# Altium schematic symbol library jlcpcb_2025_04_capacitors_extended_0603.schlib: 3668 symbols (part 12 of 20)
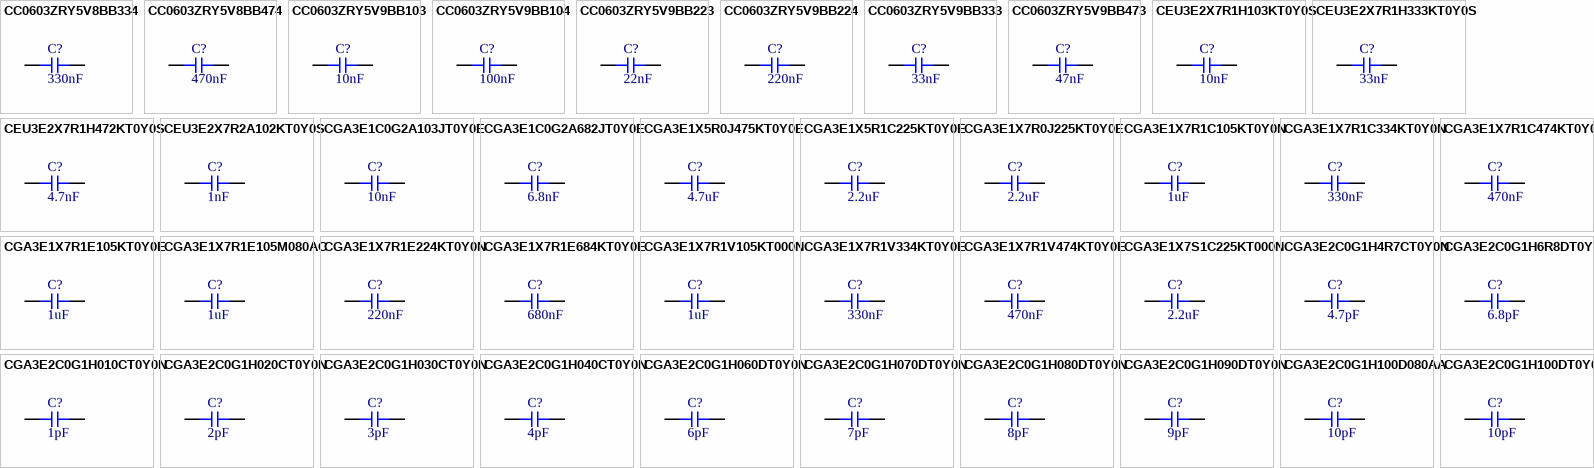
[diagram p102: symbols CC0603ZRY5V8BB334 to CGA3E2C0G1H100DT0Y0N]

## CEU3E2X7R2A102KT0Y0S
designator C?  Capacitance: 1nF  (hidden comment: *)
Capacitor, Ceramic (MLCC), 1nF, ±10%, 100V, X7R, ±10%, SMD 0603; Manufacturer: TDK; Manufacturer Part Number: CEU3E2X7R2A102KT0Y0S; Package Size: 0603; JLCPCB Basic Part: No; JLCPCB Part Number: C694208; Supplier 1: LCSC; Category: Capacitors - MLCC; Supplier Part Number 1: C694208; Tolerance: ±10%; Voltage Rating: 100V; Temperature Coefficient: X7R; RoHS: Yes; ComponentLink1Description: Datasheet; ComponentLink1URL: https://wmsc.lcsc.com/wmsc/upload/file/pdf/v2/lcsc/2011111536_TDK-CEU3E2X7R2A102KT0Y0S_C694208.pdf; ComponentLink2Description: JLCPCB Part URL; ComponentLink2URL: https://jlcpcb.com/partdetail/C694208; ComponentLink3Description: LCSC Part URL; ComponentLink3URL: https://lcsc.com/product-detail/Multilayer-Ceramic-Capacitors-MLCC---SMD-SMT_TDK-TDK-CEU3E2X7R2A102KT0Y0S_C694208.html
footprint CAP-0603 (0603 (1608M) Capacitor)
pins: 1, 2

## CGA3E1C0G2A103JT0Y0E
designator C?  Capacitance: 10nF  (hidden comment: *)
Capacitor, Ceramic (MLCC), 10nF, ±5%, 100V, C0G, ±5%, SMD 0603; Manufacturer: TDK; Manufacturer Part Number: CGA3E1C0G2A103JT0Y0E; Package Size: 0603; JLCPCB Basic Part: No; JLCPCB Part Number: C432938; Supplier 1: LCSC; Category: Capacitors - MLCC; Supplier Part Number 1: C432938; Tolerance: ±5%; Voltage Rating: 100V; Temperature Coefficient: C0G; RoHS: Yes; ComponentLink1Description: Datasheet; ComponentLink1URL: https://wmsc.lcsc.com/wmsc/upload/file/pdf/v2/lcsc/2304140030_TDK-CGA3E1C0G2A103JT0Y0E_C432938.pdf; ComponentLink2Description: JLCPCB Part URL; ComponentLink2URL: https://jlcpcb.com/partdetail/C432938; ComponentLink3Description: LCSC Part URL; ComponentLink3URL: https://lcsc.com/product-detail/Multilayer-Ceramic-Capacitors-MLCC---SMD-SMT_TDK-TDK-CGA3E1C0G2A103JT0Y0E_C432938.html
footprint CAP-0603 (0603 (1608M) Capacitor)
pins: 1, 2

## CGA3E1C0G2A682JT0Y0E
designator C?  Capacitance: 6.8nF  (hidden comment: *)
Capacitor, Ceramic (MLCC), 6.8nF, ±5%, 100V, C0G, ±5%, SMD 0603; Manufacturer: TDK; Manufacturer Part Number: CGA3E1C0G2A682JT0Y0E; Package Size: 0603; JLCPCB Basic Part: No; JLCPCB Part Number: C432939; Supplier 1: LCSC; Category: Capacitors - MLCC; Supplier Part Number 1: C432939; Tolerance: ±5%; Voltage Rating: 100V; Temperature Coefficient: C0G; RoHS: Yes; ComponentLink1Description: Datasheet; ComponentLink1URL: https://wmsc.lcsc.com/wmsc/upload/file/pdf/v2/lcsc/2304140030_TDK-CGA3E1C0G2A682JT0Y0E_C432939.pdf; ComponentLink2Description: JLCPCB Part URL; ComponentLink2URL: https://jlcpcb.com/partdetail/C432939; ComponentLink3Description: LCSC Part URL; ComponentLink3URL: https://lcsc.com/product-detail/Multilayer-Ceramic-Capacitors-MLCC---SMD-SMT_TDK-TDK-CGA3E1C0G2A682JT0Y0E_C432939.html
footprint CAP-0603 (0603 (1608M) Capacitor)
pins: 1, 2

## CGA3E1X5R0J475KT0Y0E
designator C?  Capacitance: 4.7uF  (hidden comment: *)
Capacitor, Ceramic (MLCC), 4.7uF, ±10%, 6.3V, X5R, ±10%, SMD 0603; Manufacturer: TDK; Manufacturer Part Number: CGA3E1X5R0J475KT0Y0E; Package Size: 0603; JLCPCB Basic Part: No; JLCPCB Part Number: C338087; Supplier 1: LCSC; Category: Capacitors - MLCC; Supplier Part Number 1: C338087; Tolerance: ±10%; Voltage Rating: 6.3V; Temperature Coefficient: X5R; RoHS: Yes; ComponentLink1Description: Datasheet; ComponentLink1URL: https://wmsc.lcsc.com/wmsc/upload/file/pdf/v2/lcsc/2304140030_TDK-CGA3E1X5R0J475KT0Y0E_C338087.pdf; ComponentLink2Description: JLCPCB Part URL; ComponentLink2URL: https://jlcpcb.com/partdetail/C338087; ComponentLink3Description: LCSC Part URL; ComponentLink3URL: https://lcsc.com/product-detail/Multilayer-Ceramic-Capacitors-MLCC---SMD-SMT_TDK-TDK-CGA3E1X5R0J475KT0Y0E_C338087.html
footprint CAP-0603 (0603 (1608M) Capacitor)
pins: 1, 2

## CGA3E1X5R1C225KT0Y0E
designator C?  Capacitance: 2.2uF  (hidden comment: *)
Capacitor, Ceramic (MLCC), 2.2uF, ±10%, 16V, X5R, ±10%, SMD 0603; Manufacturer: TDK; Manufacturer Part Number: CGA3E1X5R1C225KT0Y0E; Package Size: 0603; JLCPCB Basic Part: No; JLCPCB Part Number: C342965; Supplier 1: LCSC; Category: Capacitors - MLCC; Supplier Part Number 1: C342965; Tolerance: ±10%; Voltage Rating: 16V; Temperature Coefficient: X5R; RoHS: Yes; ComponentLink1Description: Datasheet; ComponentLink1URL: https://wmsc.lcsc.com/wmsc/upload/file/pdf/v2/lcsc/2304140030_TDK-CGA3E1X5R1C225KT0Y0E_C342965.pdf; ComponentLink2Description: JLCPCB Part URL; ComponentLink2URL: https://jlcpcb.com/partdetail/C342965; ComponentLink3Description: LCSC Part URL; ComponentLink3URL: https://lcsc.com/product-detail/Multilayer-Ceramic-Capacitors-MLCC---SMD-SMT_TDK-TDK-CGA3E1X5R1C225KT0Y0E_C342965.html
footprint CAP-0603 (0603 (1608M) Capacitor)
pins: 1, 2

## CGA3E1X7R0J225KT0Y0E
designator C?  Capacitance: 2.2uF  (hidden comment: *)
Capacitor, Ceramic (MLCC), 2.2uF, ±10%, 6.3V, X7R, ±10%, SMD 0603; Manufacturer: TDK; Manufacturer Part Number: CGA3E1X7R0J225KT0Y0E; Package Size: 0603; JLCPCB Basic Part: No; JLCPCB Part Number: C342879; Supplier 1: LCSC; Category: Capacitors - MLCC; Supplier Part Number 1: C342879; Tolerance: ±10%; Voltage Rating: 6.3V; Temperature Coefficient: X7R; RoHS: Yes; ComponentLink1Description: Datasheet; ComponentLink1URL: https://wmsc.lcsc.com/wmsc/upload/file/pdf/v2/lcsc/2304140030_TDK-CGA3E1X7R0J225KT0Y0E_C342879.pdf; ComponentLink2Description: JLCPCB Part URL; ComponentLink2URL: https://jlcpcb.com/partdetail/C342879; ComponentLink3Description: LCSC Part URL; ComponentLink3URL: https://lcsc.com/product-detail/Multilayer-Ceramic-Capacitors-MLCC---SMD-SMT_TDK-TDK-CGA3E1X7R0J225KT0Y0E_C342879.html
footprint CAP-0603 (0603 (1608M) Capacitor)
pins: 1, 2

## CGA3E1X7R1C105KT0Y0N
designator C?  Capacitance: 1uF  (hidden comment: *)
Capacitor, Ceramic (MLCC), 1uF, ±10%, 16V, X7R, ±10%, SMD 0603; Manufacturer: TDK; Manufacturer Part Number: CGA3E1X7R1C105KT0Y0N; Package Size: 0603; JLCPCB Basic Part: No; JLCPCB Part Number: C76706; Supplier 1: LCSC; Category: Capacitors - MLCC; Supplier Part Number 1: C76706; Tolerance: ±10%; Voltage Rating: 16V; Temperature Coefficient: X7R; RoHS: Yes; ComponentLink1Description: Datasheet; ComponentLink1URL: https://wmsc.lcsc.com/wmsc/upload/file/pdf/v2/lcsc/2304140030_TDK-CGA3E1X7R1C105KT0Y0N_C76706.pdf; ComponentLink2Description: JLCPCB Part URL; ComponentLink2URL: https://jlcpcb.com/partdetail/C76706; ComponentLink3Description: LCSC Part URL; ComponentLink3URL: https://lcsc.com/product-detail/Multilayer-Ceramic-Capacitors-MLCC---SMD-SMT_TDK-TDK-CGA3E1X7R1C105KT0Y0N_C76706.html
footprint CAP-0603 (0603 (1608M) Capacitor)
pins: 1, 2

## CGA3E1X7R1C334KT0Y0N
designator C?  Capacitance: 330nF  (hidden comment: *)
Capacitor, Ceramic (MLCC), 330nF, ±10%, 16V, X7R, ±10%, SMD 0603; Manufacturer: TDK; Manufacturer Part Number: CGA3E1X7R1C334KT0Y0N; Package Size: 0603; JLCPCB Basic Part: No; JLCPCB Part Number: C531425; Supplier 1: LCSC; Category: Capacitors - MLCC; Supplier Part Number 1: C531425; Tolerance: ±10%; Voltage Rating: 16V; Temperature Coefficient: X7R; RoHS: Yes; ComponentLink1Description: Datasheet; ComponentLink1URL: https://wmsc.lcsc.com/wmsc/upload/file/pdf/v2/lcsc/2304140030_TDK-CGA3E1X7R1C334KT0Y0N_C531425.pdf; ComponentLink2Description: JLCPCB Part URL; ComponentLink2URL: https://jlcpcb.com/partdetail/C531425; ComponentLink3Description: LCSC Part URL; ComponentLink3URL: https://lcsc.com/product-detail/Multilayer-Ceramic-Capacitors-MLCC---SMD-SMT_TDK-TDK-CGA3E1X7R1C334KT0Y0N_C531425.html
footprint CAP-0603 (0603 (1608M) Capacitor)
pins: 1, 2

## CGA3E1X7R1C474KT0Y0N
designator C?  Capacitance: 470nF  (hidden comment: *)
Capacitor, Ceramic (MLCC), 470nF, ±10%, 16V, X7R, ±10%, SMD 0603; Manufacturer: TDK; Manufacturer Part Number: CGA3E1X7R1C474KT0Y0N; Package Size: 0603; JLCPCB Basic Part: No; JLCPCB Part Number: C342915; Supplier 1: LCSC; Category: Capacitors - MLCC; Supplier Part Number 1: C342915; Tolerance: ±10%; Voltage Rating: 16V; Temperature Coefficient: X7R; RoHS: Yes; ComponentLink1Description: Datasheet; ComponentLink1URL: https://wmsc.lcsc.com/wmsc/upload/file/pdf/v2/lcsc/2304140030_TDK-CGA3E1X7R1C474KT0Y0N_C342915.pdf; ComponentLink2Description: JLCPCB Part URL; ComponentLink2URL: https://jlcpcb.com/partdetail/C342915; ComponentLink3Description: LCSC Part URL; ComponentLink3URL: https://lcsc.com/product-detail/Multilayer-Ceramic-Capacitors-MLCC---SMD-SMT_TDK-TDK-CGA3E1X7R1C474KT0Y0N_C342915.html
footprint CAP-0603 (0603 (1608M) Capacitor)
pins: 1, 2

## CGA3E1X7R1E105KT0Y0E
designator C?  Capacitance: 1uF  (hidden comment: *)
Capacitor, Ceramic (MLCC), 1uF, ±10%, 25V, X7R, ±10%, SMD 0603; Manufacturer: TDK; Manufacturer Part Number: CGA3E1X7R1E105KT0Y0E; Package Size: 0603; JLCPCB Basic Part: No; JLCPCB Part Number: C76708; Supplier 1: LCSC; Category: Capacitors - MLCC; Supplier Part Number 1: C76708; Tolerance: ±10%; Voltage Rating: 25V; Temperature Coefficient: X7R; RoHS: Yes; ComponentLink1Description: Datasheet; ComponentLink1URL: https://wmsc.lcsc.com/wmsc/upload/file/pdf/v2/lcsc/2304140030_TDK-CGA3E1X7R1E105KT0Y0E_C76708.pdf; ComponentLink2Description: JLCPCB Part URL; ComponentLink2URL: https://jlcpcb.com/partdetail/C76708; ComponentLink3Description: LCSC Part URL; ComponentLink3URL: https://lcsc.com/product-detail/Multilayer-Ceramic-Capacitors-MLCC---SMD-SMT_TDK-TDK-CGA3E1X7R1E105KT0Y0E_C76708.html
footprint CAP-0603 (0603 (1608M) Capacitor)
pins: 1, 2

## CGA3E1X7R1E105M080AC
designator C?  Capacitance: 1uF  (hidden comment: *)
Capacitor, Ceramic (MLCC), 1uF, ±20%, 25V, X7R, ±20%, SMD 0603; Manufacturer: TDK; Manufacturer Part Number: CGA3E1X7R1E105M080AC; Package Size: 0603; JLCPCB Basic Part: No; JLCPCB Part Number: C163178; Supplier 1: LCSC; Category: Capacitors - MLCC; Supplier Part Number 1: C163178; Tolerance: ±20%; Voltage Rating: 25V; Temperature Coefficient: X7R; RoHS: Yes; ComponentLink1Description: Datasheet; ComponentLink1URL: https://wmsc.lcsc.com/wmsc/upload/file/pdf/v2/lcsc/2304140030_TDK-CGA3E1X7R1E105M080AC_C163178.pdf; ComponentLink2Description: JLCPCB Part URL; ComponentLink2URL: https://jlcpcb.com/partdetail/C163178; ComponentLink3Description: LCSC Part URL; ComponentLink3URL: https://lcsc.com/product-detail/Multilayer-Ceramic-Capacitors-MLCC---SMD-SMT_TDK-TDK-CGA3E1X7R1E105M080AC_C163178.html
footprint CAP-0603 (0603 (1608M) Capacitor)
pins: 1, 2

## CGA3E1X7R1E224KT0Y0N
designator C?  Capacitance: 220nF  (hidden comment: *)
Capacitor, Ceramic (MLCC), 220nF, ±10%, 25V, X7R, ±10%, SMD 0603; Manufacturer: TDK; Manufacturer Part Number: CGA3E1X7R1E224KT0Y0N; Package Size: 0603; JLCPCB Basic Part: No; JLCPCB Part Number: C343001; Supplier 1: LCSC; Category: Capacitors - MLCC; Supplier Part Number 1: C343001; Tolerance: ±10%; Voltage Rating: 25V; Temperature Coefficient: X7R; RoHS: Yes; ComponentLink1Description: Datasheet; ComponentLink1URL: https://wmsc.lcsc.com/wmsc/upload/file/pdf/v2/lcsc/2304140030_TDK-CGA3E1X7R1E224KT0Y0N_C343001.pdf; ComponentLink2Description: JLCPCB Part URL; ComponentLink2URL: https://jlcpcb.com/partdetail/C343001; ComponentLink3Description: LCSC Part URL; ComponentLink3URL: https://lcsc.com/product-detail/Multilayer-Ceramic-Capacitors-MLCC---SMD-SMT_TDK-TDK-CGA3E1X7R1E224KT0Y0N_C343001.html
footprint CAP-0603 (0603 (1608M) Capacitor)
pins: 1, 2

## CGA3E1X7R1E684KT0Y0E
designator C?  Capacitance: 680nF  (hidden comment: *)
Capacitor, Ceramic (MLCC), 680nF, ±10%, 25V, X7R, ±10%, SMD 0603; Manufacturer: TDK; Manufacturer Part Number: CGA3E1X7R1E684KT0Y0E; Package Size: 0603; JLCPCB Basic Part: No; JLCPCB Part Number: C342960; Supplier 1: LCSC; Category: Capacitors - MLCC; Supplier Part Number 1: C342960; Tolerance: ±10%; Voltage Rating: 25V; Temperature Coefficient: X7R; RoHS: Yes; ComponentLink1Description: Datasheet; ComponentLink1URL: https://wmsc.lcsc.com/wmsc/upload/file/pdf/v2/lcsc/2304140030_TDK-CGA3E1X7R1E684KT0Y0E_C342960.pdf; ComponentLink2Description: JLCPCB Part URL; ComponentLink2URL: https://jlcpcb.com/partdetail/C342960; ComponentLink3Description: LCSC Part URL; ComponentLink3URL: https://lcsc.com/product-detail/Multilayer-Ceramic-Capacitors-MLCC---SMD-SMT_TDK-TDK-CGA3E1X7R1E684KT0Y0E_C342960.html
footprint CAP-0603 (0603 (1608M) Capacitor)
pins: 1, 2

## CGA3E1X7R1V105KT000N
designator C?  Capacitance: 1uF  (hidden comment: *)
Capacitor, Ceramic (MLCC), 1uF, ±10%, 35V, X7R, ±10%, SMD 0603; Manufacturer: TDK; Manufacturer Part Number: CGA3E1X7R1V105KT000N; Package Size: 0603; JLCPCB Basic Part: No; JLCPCB Part Number: C342956; Supplier 1: LCSC; Category: Capacitors - MLCC; Supplier Part Number 1: C342956; Tolerance: ±10%; Voltage Rating: 35V; Temperature Coefficient: X7R; RoHS: Yes; ComponentLink1Description: Datasheet; ComponentLink1URL: https://wmsc.lcsc.com/wmsc/upload/file/pdf/v2/lcsc/2304140030_TDK-CGA3E1X7R1V105KT000N_C342956.pdf; ComponentLink2Description: JLCPCB Part URL; ComponentLink2URL: https://jlcpcb.com/partdetail/C342956; ComponentLink3Description: LCSC Part URL; ComponentLink3URL: https://lcsc.com/product-detail/Multilayer-Ceramic-Capacitors-MLCC---SMD-SMT_TDK-TDK-CGA3E1X7R1V105KT000N_C342956.html
footprint CAP-0603 (0603 (1608M) Capacitor)
pins: 1, 2

## CGA3E1X7R1V334KT0Y0E
designator C?  Capacitance: 330nF  (hidden comment: *)
Capacitor, Ceramic (MLCC), 330nF, ±10%, 35V, X7R, ±10%, SMD 0603; Manufacturer: TDK; Manufacturer Part Number: CGA3E1X7R1V334KT0Y0E; Package Size: 0603; JLCPCB Basic Part: No; JLCPCB Part Number: C694217; Supplier 1: LCSC; Category: Capacitors - MLCC; Supplier Part Number 1: C694217; Tolerance: ±10%; Voltage Rating: 35V; Temperature Coefficient: X7R; RoHS: Yes; ComponentLink1Description: Datasheet; ComponentLink1URL: https://wmsc.lcsc.com/wmsc/upload/file/pdf/v2/lcsc/2304140030_TDK-CGA3E1X7R1V334KT0Y0E_C694217.pdf; ComponentLink2Description: JLCPCB Part URL; ComponentLink2URL: https://jlcpcb.com/partdetail/C694217; ComponentLink3Description: LCSC Part URL; ComponentLink3URL: https://lcsc.com/product-detail/Multilayer-Ceramic-Capacitors-MLCC---SMD-SMT_TDK-TDK-CGA3E1X7R1V334KT0Y0E_C694217.html
footprint CAP-0603 (0603 (1608M) Capacitor)
pins: 1, 2

## CGA3E1X7R1V474KT0Y0E
designator C?  Capacitance: 470nF  (hidden comment: *)
Capacitor, Ceramic (MLCC), 470nF, ±10%, 35V, X7R, ±10%, SMD 0603; Manufacturer: TDK; Manufacturer Part Number: CGA3E1X7R1V474KT0Y0E; Package Size: 0603; JLCPCB Basic Part: No; JLCPCB Part Number: C342961; Supplier 1: LCSC; Category: Capacitors - MLCC; Supplier Part Number 1: C342961; Tolerance: ±10%; Voltage Rating: 35V; Temperature Coefficient: X7R; RoHS: Yes; ComponentLink1Description: Datasheet; ComponentLink1URL: https://wmsc.lcsc.com/wmsc/upload/file/pdf/v2/lcsc/2207261800_TDK-CGA3E1X7R1V474KT0Y0E_C342961.pdf; ComponentLink2Description: JLCPCB Part URL; ComponentLink2URL: https://jlcpcb.com/partdetail/C342961; ComponentLink3Description: LCSC Part URL; ComponentLink3URL: https://lcsc.com/product-detail/Multilayer-Ceramic-Capacitors-MLCC---SMD-SMT_TDK-TDK-CGA3E1X7R1V474KT0Y0E_C342961.html
footprint CAP-0603 (0603 (1608M) Capacitor)
pins: 1, 2

## CGA3E1X7S1C225KT000N
designator C?  Capacitance: 2.2uF  (hidden comment: *)
Capacitor, Ceramic (MLCC), 2.2uF, ±10%, 16V, X7S, ±10%, SMD 0603; Manufacturer: TDK; Manufacturer Part Number: CGA3E1X7S1C225KT000N; Package Size: 0603; JLCPCB Basic Part: No; JLCPCB Part Number: C338110; Supplier 1: LCSC; Category: Capacitors - MLCC; Supplier Part Number 1: C338110; Tolerance: ±10%; Voltage Rating: 16V; Temperature Coefficient: X7S; RoHS: Yes; ComponentLink1Description: Datasheet; ComponentLink1URL: https://wmsc.lcsc.com/wmsc/upload/file/pdf/v2/lcsc/2304140030_TDK-CGA3E1X7S1C225KT000N_C338110.pdf; ComponentLink2Description: JLCPCB Part URL; ComponentLink2URL: https://jlcpcb.com/partdetail/C338110; ComponentLink3Description: LCSC Part URL; ComponentLink3URL: https://lcsc.com/product-detail/Multilayer-Ceramic-Capacitors-MLCC---SMD-SMT_TDK-TDK-CGA3E1X7S1C225KT000N_C338110.html
footprint CAP-0603 (0603 (1608M) Capacitor)
pins: 1, 2

## CGA3E2C0G1H4R7CT0Y0N
designator C?  Capacitance: 4.7pF  (hidden comment: *)
Capacitor, Ceramic (MLCC), 4.7pF, 50V, C0G, SMD 0603; Manufacturer: TDK; Manufacturer Part Number: CGA3E2C0G1H4R7CT0Y0N; Package Size: 0603; JLCPCB Basic Part: No; JLCPCB Part Number: C342896; Supplier 1: LCSC; Category: Capacitors - MLCC; Supplier Part Number 1: C342896; Voltage Rating: 50V; Temperature Coefficient: C0G; RoHS: Yes; ComponentLink1Description: Datasheet; ComponentLink1URL: https://wmsc.lcsc.com/wmsc/upload/file/pdf/v2/lcsc/2304140030_TDK-CGA3E2C0G1H4R7CT0Y0N_C342896.pdf; ComponentLink2Description: JLCPCB Part URL; ComponentLink2URL: https://jlcpcb.com/partdetail/C342896; ComponentLink3Description: LCSC Part URL; ComponentLink3URL: https://lcsc.com/product-detail/Multilayer-Ceramic-Capacitors-MLCC---SMD-SMT_TDK-TDK-CGA3E2C0G1H4R7CT0Y0N_C342896.html
footprint CAP-0603 (0603 (1608M) Capacitor)
pins: 1, 2

## CGA3E2C0G1H6R8DT0Y0N
designator C?  Capacitance: 6.8pF  (hidden comment: *)
Capacitor, Ceramic (MLCC), 6.8pF, 50V, C0G, SMD 0603; Manufacturer: TDK; Manufacturer Part Number: CGA3E2C0G1H6R8DT0Y0N; Package Size: 0603; JLCPCB Basic Part: No; JLCPCB Part Number: C695158; Supplier 1: LCSC; Category: Capacitors - MLCC; Supplier Part Number 1: C695158; Voltage Rating: 50V; Temperature Coefficient: C0G; RoHS: Yes; ComponentLink1Description: Datasheet; ComponentLink1URL: https://wmsc.lcsc.com/wmsc/upload/file/pdf/v2/lcsc/2304140030_TDK-CGA3E2C0G1H6R8DT0Y0N_C695158.pdf; ComponentLink2Description: JLCPCB Part URL; ComponentLink2URL: https://jlcpcb.com/partdetail/C695158; ComponentLink3Description: LCSC Part URL; ComponentLink3URL: https://lcsc.com/product-detail/Multilayer-Ceramic-Capacitors-MLCC---SMD-SMT_TDK-TDK-CGA3E2C0G1H6R8DT0Y0N_C695158.html
footprint CAP-0603 (0603 (1608M) Capacitor)
pins: 1, 2

## CGA3E2C0G1H010CT0Y0N
designator C?  Capacitance: 1pF  (hidden comment: *)
Capacitor, Ceramic (MLCC), 1pF, 50V, C0G, SMD 0603; Manufacturer: TDK; Manufacturer Part Number: CGA3E2C0G1H010CT0Y0N; Package Size: 0603; JLCPCB Basic Part: No; JLCPCB Part Number: C165824; Supplier 1: LCSC; Category: Capacitors - MLCC; Supplier Part Number 1: C165824; Voltage Rating: 50V; Temperature Coefficient: C0G; RoHS: Yes; ComponentLink1Description: Datasheet; ComponentLink1URL: https://wmsc.lcsc.com/wmsc/upload/file/pdf/v2/lcsc/2304140030_TDK-CGA3E2C0G1H010CT0Y0N_C165824.pdf; ComponentLink2Description: JLCPCB Part URL; ComponentLink2URL: https://jlcpcb.com/partdetail/C165824; ComponentLink3Description: LCSC Part URL; ComponentLink3URL: https://lcsc.com/product-detail/Multilayer-Ceramic-Capacitors-MLCC---SMD-SMT_TDK-TDK-CGA3E2C0G1H010CT0Y0N_C165824.html
footprint CAP-0603 (0603 (1608M) Capacitor)
pins: 1, 2

## CGA3E2C0G1H020CT0Y0N
designator C?  Capacitance: 2pF  (hidden comment: *)
Capacitor, Ceramic (MLCC), 2pF, 50V, C0G, SMD 0603; Manufacturer: TDK; Manufacturer Part Number: CGA3E2C0G1H020CT0Y0N; Package Size: 0603; JLCPCB Basic Part: No; JLCPCB Part Number: C880692; Supplier 1: LCSC; Category: Capacitors - MLCC; Supplier Part Number 1: C880692; Voltage Rating: 50V; Temperature Coefficient: C0G; RoHS: Yes; ComponentLink1Description: Datasheet; ComponentLink1URL: https://wmsc.lcsc.com/wmsc/upload/file/pdf/v2/lcsc/2304140030_TDK-CGA3E2C0G1H020CT0Y0N_C880692.pdf; ComponentLink2Description: JLCPCB Part URL; ComponentLink2URL: https://jlcpcb.com/partdetail/C880692; ComponentLink3Description: LCSC Part URL; ComponentLink3URL: https://lcsc.com/product-detail/Multilayer-Ceramic-Capacitors-MLCC---SMD-SMT_TDK-TDK-CGA3E2C0G1H020CT0Y0N_C880692.html
footprint CAP-0603 (0603 (1608M) Capacitor)
pins: 1, 2

## CGA3E2C0G1H030CT0Y0N
designator C?  Capacitance: 3pF  (hidden comment: *)
Capacitor, Ceramic (MLCC), 3pF, 50V, C0G, SMD 0603; Manufacturer: TDK; Manufacturer Part Number: CGA3E2C0G1H030CT0Y0N; Package Size: 0603; JLCPCB Basic Part: No; JLCPCB Part Number: C695157; Supplier 1: LCSC; Category: Capacitors - MLCC; Supplier Part Number 1: C695157; Voltage Rating: 50V; Temperature Coefficient: C0G; RoHS: Yes; ComponentLink1Description: Datasheet; ComponentLink1URL: https://wmsc.lcsc.com/wmsc/upload/file/pdf/v2/lcsc/2304140030_TDK-CGA3E2C0G1H030CT0Y0N_C695157.pdf; ComponentLink2Description: JLCPCB Part URL; ComponentLink2URL: https://jlcpcb.com/partdetail/C695157; ComponentLink3Description: LCSC Part URL; ComponentLink3URL: https://lcsc.com/product-detail/Multilayer-Ceramic-Capacitors-MLCC---SMD-SMT_TDK-TDK-CGA3E2C0G1H030CT0Y0N_C695157.html
footprint CAP-0603 (0603 (1608M) Capacitor)
pins: 1, 2

## CGA3E2C0G1H040CT0Y0N
designator C?  Capacitance: 4pF  (hidden comment: *)
Capacitor, Ceramic (MLCC), 4pF, 50V, C0G, SMD 0603; Manufacturer: TDK; Manufacturer Part Number: CGA3E2C0G1H040CT0Y0N; Package Size: 0603; JLCPCB Basic Part: No; JLCPCB Part Number: C694218; Supplier 1: LCSC; Category: Capacitors - MLCC; Supplier Part Number 1: C694218; Voltage Rating: 50V; Temperature Coefficient: C0G; RoHS: Yes; ComponentLink1Description: Datasheet; ComponentLink1URL: https://wmsc.lcsc.com/wmsc/upload/file/pdf/v2/lcsc/2304140030_TDK-CGA3E2C0G1H040CT0Y0N_C694218.pdf; ComponentLink2Description: JLCPCB Part URL; ComponentLink2URL: https://jlcpcb.com/partdetail/C694218; ComponentLink3Description: LCSC Part URL; ComponentLink3URL: https://lcsc.com/product-detail/Multilayer-Ceramic-Capacitors-MLCC---SMD-SMT_TDK-TDK-CGA3E2C0G1H040CT0Y0N_C694218.html
footprint CAP-0603 (0603 (1608M) Capacitor)
pins: 1, 2

## CGA3E2C0G1H060DT0Y0N
designator C?  Capacitance: 6pF  (hidden comment: *)
Capacitor, Ceramic (MLCC), 6pF, 50V, C0G, SMD 0603; Manufacturer: TDK; Manufacturer Part Number: CGA3E2C0G1H060DT0Y0N; Package Size: 0603; JLCPCB Basic Part: No; JLCPCB Part Number: C694219; Supplier 1: LCSC; Category: Capacitors - MLCC; Supplier Part Number 1: C694219; Voltage Rating: 50V; Temperature Coefficient: C0G; RoHS: Yes; ComponentLink1Description: Datasheet; ComponentLink1URL: https://wmsc.lcsc.com/wmsc/upload/file/pdf/v2/lcsc/2304140030_TDK-CGA3E2C0G1H060DT0Y0N_C694219.pdf; ComponentLink2Description: JLCPCB Part URL; ComponentLink2URL: https://jlcpcb.com/partdetail/C694219; ComponentLink3Description: LCSC Part URL; ComponentLink3URL: https://lcsc.com/product-detail/Multilayer-Ceramic-Capacitors-MLCC---SMD-SMT_TDK-TDK-CGA3E2C0G1H060DT0Y0N_C694219.html
footprint CAP-0603 (0603 (1608M) Capacitor)
pins: 1, 2

## CGA3E2C0G1H070DT0Y0N
designator C?  Capacitance: 7pF  (hidden comment: *)
Capacitor, Ceramic (MLCC), 7pF, 50V, C0G, SMD 0603; Manufacturer: TDK; Manufacturer Part Number: CGA3E2C0G1H070DT0Y0N; Package Size: 0603; JLCPCB Basic Part: No; JLCPCB Part Number: C694220; Supplier 1: LCSC; Category: Capacitors - MLCC; Supplier Part Number 1: C694220; Voltage Rating: 50V; Temperature Coefficient: C0G; RoHS: Yes; ComponentLink1Description: Datasheet; ComponentLink1URL: https://wmsc.lcsc.com/wmsc/upload/file/pdf/v2/lcsc/2304140030_TDK-CGA3E2C0G1H070DT0Y0N_C694220.pdf; ComponentLink2Description: JLCPCB Part URL; ComponentLink2URL: https://jlcpcb.com/partdetail/C694220; ComponentLink3Description: LCSC Part URL; ComponentLink3URL: https://lcsc.com/product-detail/Multilayer-Ceramic-Capacitors-MLCC---SMD-SMT_TDK-TDK-CGA3E2C0G1H070DT0Y0N_C694220.html
footprint CAP-0603 (0603 (1608M) Capacitor)
pins: 1, 2

## CGA3E2C0G1H080DT0Y0N
designator C?  Capacitance: 8pF  (hidden comment: *)
Capacitor, Ceramic (MLCC), 8pF, 50V, C0G, SMD 0603; Manufacturer: TDK; Manufacturer Part Number: CGA3E2C0G1H080DT0Y0N; Package Size: 0603; JLCPCB Basic Part: No; JLCPCB Part Number: C165823; Supplier 1: LCSC; Category: Capacitors - MLCC; Supplier Part Number 1: C165823; Voltage Rating: 50V; Temperature Coefficient: C0G; RoHS: Yes; ComponentLink1Description: Datasheet; ComponentLink1URL: https://wmsc.lcsc.com/wmsc/upload/file/pdf/v2/lcsc/2304140030_TDK-CGA3E2C0G1H080DT0Y0N_C165823.pdf; ComponentLink2Description: JLCPCB Part URL; ComponentLink2URL: https://jlcpcb.com/partdetail/C165823; ComponentLink3Description: LCSC Part URL; ComponentLink3URL: https://lcsc.com/product-detail/Multilayer-Ceramic-Capacitors-MLCC---SMD-SMT_TDK-TDK-CGA3E2C0G1H080DT0Y0N_C165823.html
footprint CAP-0603 (0603 (1608M) Capacitor)
pins: 1, 2

## CGA3E2C0G1H090DT0Y0N
designator C?  Capacitance: 9pF  (hidden comment: *)
Capacitor, Ceramic (MLCC), 9pF, 50V, C0G, SMD 0603; Manufacturer: TDK; Manufacturer Part Number: CGA3E2C0G1H090DT0Y0N; Package Size: 0603; JLCPCB Basic Part: No; JLCPCB Part Number: C695382; Supplier 1: LCSC; Category: Capacitors - MLCC; Supplier Part Number 1: C695382; Voltage Rating: 50V; Temperature Coefficient: C0G; RoHS: Yes; ComponentLink1Description: Datasheet; ComponentLink1URL: https://wmsc.lcsc.com/wmsc/upload/file/pdf/v2/lcsc/2304140030_TDK-CGA3E2C0G1H090DT0Y0N_C695382.pdf; ComponentLink2Description: JLCPCB Part URL; ComponentLink2URL: https://jlcpcb.com/partdetail/C695382; ComponentLink3Description: LCSC Part URL; ComponentLink3URL: https://lcsc.com/product-detail/Multilayer-Ceramic-Capacitors-MLCC---SMD-SMT_TDK-TDK-CGA3E2C0G1H090DT0Y0N_C695382.html
footprint CAP-0603 (0603 (1608M) Capacitor)
pins: 1, 2

## CGA3E2C0G1H100D080AA
designator C?  Capacitance: 10pF  (hidden comment: *)
Capacitor, Ceramic (MLCC), 10pF, 50V, C0G, SMD 0603; Manufacturer: TDK; Manufacturer Part Number: CGA3E2C0G1H100D080AA; Package Size: 0603; JLCPCB Basic Part: No; JLCPCB Part Number: C171806; Supplier 1: LCSC; Category: Capacitors - MLCC; Supplier Part Number 1: C171806; Voltage Rating: 50V; Temperature Coefficient: C0G; RoHS: Yes; ComponentLink1Description: Datasheet; ComponentLink1URL: https://wmsc.lcsc.com/wmsc/upload/file/pdf/v2/lcsc/2304140030_TDK-CGA3E2C0G1H100D080AA_C171806.pdf; ComponentLink2Description: JLCPCB Part URL; ComponentLink2URL: https://jlcpcb.com/partdetail/C171806; ComponentLink3Description: LCSC Part URL; ComponentLink3URL: https://lcsc.com/product-detail/Multilayer-Ceramic-Capacitors-MLCC---SMD-SMT_TDK-TDK-CGA3E2C0G1H100D080AA_C171806.html
footprint CAP-0603 (0603 (1608M) Capacitor)
pins: 1, 2

## CGA3E2C0G1H100DT0Y0N
designator C?  Capacitance: 10pF  (hidden comment: *)
Capacitor, Ceramic (MLCC), 10pF, 50V, C0G, SMD 0603; Manufacturer: TDK; Manufacturer Part Number: CGA3E2C0G1H100DT0Y0N; Package Size: 0603; JLCPCB Basic Part: No; JLCPCB Part Number: C342892; Supplier 1: LCSC; Category: Capacitors - MLCC; Supplier Part Number 1: C342892; Voltage Rating: 50V; Temperature Coefficient: C0G; RoHS: Yes; ComponentLink1Description: Datasheet; ComponentLink1URL: https://wmsc.lcsc.com/wmsc/upload/file/pdf/v2/lcsc/2304140030_TDK-CGA3E2C0G1H100DT0Y0N_C342892.pdf; ComponentLink2Description: JLCPCB Part URL; ComponentLink2URL: https://jlcpcb.com/partdetail/C342892; ComponentLink3Description: LCSC Part URL; ComponentLink3URL: https://lcsc.com/product-detail/Multilayer-Ceramic-Capacitors-MLCC---SMD-SMT_TDK-TDK-CGA3E2C0G1H100DT0Y0N_C342892.html
footprint CAP-0603 (0603 (1608M) Capacitor)
pins: 1, 2

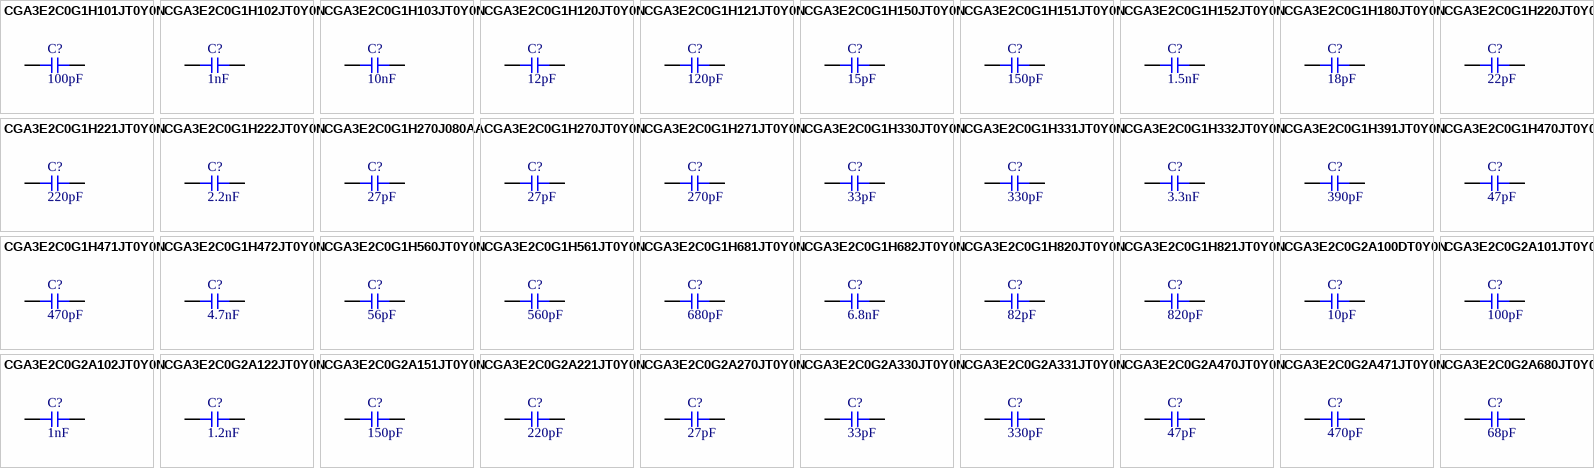
[diagram p52: symbols CGA3E2C0G1H101JT0Y0N to CGA3E2C0G2A680JT0Y0N]

## CGA3E2C0G1H101JT0Y0N
designator C?  Capacitance: 100pF  (hidden comment: *)
Capacitor, Ceramic (MLCC), 100pF, ±5%, 50V, C0G, ±5%, SMD 0603; Manufacturer: TDK; Manufacturer Part Number: CGA3E2C0G1H101JT0Y0N; Package Size: 0603; JLCPCB Basic Part: No; JLCPCB Part Number: C76709; Supplier 1: LCSC; Category: Capacitors - MLCC; Supplier Part Number 1: C76709; Tolerance: ±5%; Voltage Rating: 50V; Temperature Coefficient: C0G; RoHS: Yes; ComponentLink1Description: Datasheet; ComponentLink1URL: https://wmsc.lcsc.com/wmsc/upload/file/pdf/v2/lcsc/2304140030_TDK-CGA3E2C0G1H101JT0Y0N_C76709.pdf; ComponentLink2Description: JLCPCB Part URL; ComponentLink2URL: https://jlcpcb.com/partdetail/C76709; ComponentLink3Description: LCSC Part URL; ComponentLink3URL: https://lcsc.com/product-detail/Multilayer-Ceramic-Capacitors-MLCC---SMD-SMT_TDK-TDK-CGA3E2C0G1H101JT0Y0N_C76709.html
footprint CAP-0603 (0603 (1608M) Capacitor)
pins: 1, 2

## CGA3E2C0G1H102JT0Y0N
designator C?  Capacitance: 1nF  (hidden comment: *)
Capacitor, Ceramic (MLCC), 1nF, ±5%, 50V, C0G, ±5%, SMD 0603; Manufacturer: TDK; Manufacturer Part Number: CGA3E2C0G1H102JT0Y0N; Package Size: 0603; JLCPCB Basic Part: No; JLCPCB Part Number: C342910; Supplier 1: LCSC; Category: Capacitors - MLCC; Supplier Part Number 1: C342910; Tolerance: ±5%; Voltage Rating: 50V; Temperature Coefficient: C0G; RoHS: Yes; ComponentLink1Description: Datasheet; ComponentLink1URL: https://wmsc.lcsc.com/wmsc/upload/file/pdf/v2/lcsc/2304140030_TDK-CGA3E2C0G1H102JT0Y0N_C342910.pdf; ComponentLink2Description: JLCPCB Part URL; ComponentLink2URL: https://jlcpcb.com/partdetail/C342910; ComponentLink3Description: LCSC Part URL; ComponentLink3URL: https://lcsc.com/product-detail/Multilayer-Ceramic-Capacitors-MLCC---SMD-SMT_TDK-TDK-CGA3E2C0G1H102JT0Y0N_C342910.html
footprint CAP-0603 (0603 (1608M) Capacitor)
pins: 1, 2

## CGA3E2C0G1H103JT0Y0N
designator C?  Capacitance: 10nF  (hidden comment: *)
Capacitor, Ceramic (MLCC), 10nF, ±5%, 50V, C0G, ±5%, SMD 0603; Manufacturer: TDK; Manufacturer Part Number: CGA3E2C0G1H103JT0Y0N; Package Size: 0603; JLCPCB Basic Part: No; JLCPCB Part Number: C76710; Supplier 1: LCSC; Category: Capacitors - MLCC; Supplier Part Number 1: C76710; Tolerance: ±5%; Voltage Rating: 50V; Temperature Coefficient: C0G; RoHS: Yes; ComponentLink1Description: Datasheet; ComponentLink1URL: https://wmsc.lcsc.com/wmsc/upload/file/pdf/v2/lcsc/2304140030_TDK-CGA3E2C0G1H103JT0Y0N_C76710.pdf; ComponentLink2Description: JLCPCB Part URL; ComponentLink2URL: https://jlcpcb.com/partdetail/C76710; ComponentLink3Description: LCSC Part URL; ComponentLink3URL: https://lcsc.com/product-detail/Multilayer-Ceramic-Capacitors-MLCC---SMD-SMT_TDK-TDK-CGA3E2C0G1H103JT0Y0N_C76710.html
footprint CAP-0603 (0603 (1608M) Capacitor)
pins: 1, 2

## CGA3E2C0G1H120JT0Y0N
designator C?  Capacitance: 12pF  (hidden comment: *)
Capacitor, Ceramic (MLCC), 12pF, ±5%, 50V, C0G, ±5%, SMD 0603; Manufacturer: TDK; Manufacturer Part Number: CGA3E2C0G1H120JT0Y0N; Package Size: 0603; JLCPCB Basic Part: No; JLCPCB Part Number: C342888; Supplier 1: LCSC; Category: Capacitors - MLCC; Supplier Part Number 1: C342888; Tolerance: ±5%; Voltage Rating: 50V; Temperature Coefficient: C0G; RoHS: Yes; ComponentLink1Description: Datasheet; ComponentLink1URL: https://wmsc.lcsc.com/wmsc/upload/file/pdf/v2/lcsc/2304140030_TDK-CGA3E2C0G1H120JT0Y0N_C342888.pdf; ComponentLink2Description: JLCPCB Part URL; ComponentLink2URL: https://jlcpcb.com/partdetail/C342888; ComponentLink3Description: LCSC Part URL; ComponentLink3URL: https://lcsc.com/product-detail/Multilayer-Ceramic-Capacitors-MLCC---SMD-SMT_TDK-TDK-CGA3E2C0G1H120JT0Y0N_C342888.html
footprint CAP-0603 (0603 (1608M) Capacitor)
pins: 1, 2

## CGA3E2C0G1H121JT0Y0N
designator C?  Capacitance: 120pF  (hidden comment: *)
Capacitor, Ceramic (MLCC), 120pF, ±5%, 50V, C0G, ±5%, SMD 0603; Manufacturer: TDK; Manufacturer Part Number: CGA3E2C0G1H121JT0Y0N; Package Size: 0603; JLCPCB Basic Part: No; JLCPCB Part Number: C338050; Supplier 1: LCSC; Category: Capacitors - MLCC; Supplier Part Number 1: C338050; Tolerance: ±5%; Voltage Rating: 50V; Temperature Coefficient: C0G; RoHS: Yes; ComponentLink1Description: Datasheet; ComponentLink1URL: https://wmsc.lcsc.com/wmsc/upload/file/pdf/v2/lcsc/2304140030_TDK-CGA3E2C0G1H121JT0Y0N_C338050.pdf; ComponentLink2Description: JLCPCB Part URL; ComponentLink2URL: https://jlcpcb.com/partdetail/C338050; ComponentLink3Description: LCSC Part URL; ComponentLink3URL: https://lcsc.com/product-detail/Multilayer-Ceramic-Capacitors-MLCC---SMD-SMT_TDK-TDK-CGA3E2C0G1H121JT0Y0N_C338050.html
footprint CAP-0603 (0603 (1608M) Capacitor)
pins: 1, 2

## CGA3E2C0G1H150JT0Y0N
designator C?  Capacitance: 15pF  (hidden comment: *)
Capacitor, Ceramic (MLCC), 15pF, ±5%, 50V, C0G, ±5%, SMD 0603; Manufacturer: TDK; Manufacturer Part Number: CGA3E2C0G1H150JT0Y0N; Package Size: 0603; JLCPCB Basic Part: No; JLCPCB Part Number: C342889; Supplier 1: LCSC; Category: Capacitors - MLCC; Supplier Part Number 1: C342889; Tolerance: ±5%; Voltage Rating: 50V; Temperature Coefficient: C0G; RoHS: Yes; ComponentLink1Description: Datasheet; ComponentLink1URL: https://wmsc.lcsc.com/wmsc/upload/file/pdf/v2/lcsc/2304140030_TDK-CGA3E2C0G1H150JT0Y0N_C342889.pdf; ComponentLink2Description: JLCPCB Part URL; ComponentLink2URL: https://jlcpcb.com/partdetail/C342889; ComponentLink3Description: LCSC Part URL; ComponentLink3URL: https://lcsc.com/product-detail/Multilayer-Ceramic-Capacitors-MLCC---SMD-SMT_TDK-TDK-CGA3E2C0G1H150JT0Y0N_C342889.html
footprint CAP-0603 (0603 (1608M) Capacitor)
pins: 1, 2

## CGA3E2C0G1H151JT0Y0N
designator C?  Capacitance: 150pF  (hidden comment: *)
Capacitor, Ceramic (MLCC), 150pF, ±5%, 50V, C0G, ±5%, SMD 0603; Manufacturer: TDK; Manufacturer Part Number: CGA3E2C0G1H151JT0Y0N; Package Size: 0603; JLCPCB Basic Part: No; JLCPCB Part Number: C342906; Supplier 1: LCSC; Category: Capacitors - MLCC; Supplier Part Number 1: C342906; Tolerance: ±5%; Voltage Rating: 50V; Temperature Coefficient: C0G; RoHS: Yes; ComponentLink1Description: Datasheet; ComponentLink1URL: https://wmsc.lcsc.com/wmsc/upload/file/pdf/v2/lcsc/2304140030_TDK-CGA3E2C0G1H151JT0Y0N_C342906.pdf; ComponentLink2Description: JLCPCB Part URL; ComponentLink2URL: https://jlcpcb.com/partdetail/C342906; ComponentLink3Description: LCSC Part URL; ComponentLink3URL: https://lcsc.com/product-detail/Multilayer-Ceramic-Capacitors-MLCC---SMD-SMT_TDK-TDK-CGA3E2C0G1H151JT0Y0N_C342906.html
footprint CAP-0603 (0603 (1608M) Capacitor)
pins: 1, 2

## CGA3E2C0G1H152JT0Y0N
designator C?  Capacitance: 1.5nF  (hidden comment: *)
Capacitor, Ceramic (MLCC), 1.5nF, ±5%, 50V, C0G, ±5%, SMD 0603; Manufacturer: TDK; Manufacturer Part Number: CGA3E2C0G1H152JT0Y0N; Package Size: 0603; JLCPCB Basic Part: No; JLCPCB Part Number: C694221; Supplier 1: LCSC; Category: Capacitors - MLCC; Supplier Part Number 1: C694221; Tolerance: ±5%; Voltage Rating: 50V; Temperature Coefficient: C0G; RoHS: Yes; ComponentLink1Description: Datasheet; ComponentLink1URL: https://wmsc.lcsc.com/wmsc/upload/file/pdf/v2/lcsc/2304140030_TDK-CGA3E2C0G1H152JT0Y0N_C694221.pdf; ComponentLink2Description: JLCPCB Part URL; ComponentLink2URL: https://jlcpcb.com/partdetail/C694221; ComponentLink3Description: LCSC Part URL; ComponentLink3URL: https://lcsc.com/product-detail/Multilayer-Ceramic-Capacitors-MLCC---SMD-SMT_TDK-TDK-CGA3E2C0G1H152JT0Y0N_C694221.html
footprint CAP-0603 (0603 (1608M) Capacitor)
pins: 1, 2

## CGA3E2C0G1H180JT0Y0N
designator C?  Capacitance: 18pF  (hidden comment: *)
Capacitor, Ceramic (MLCC), 18pF, ±5%, 50V, C0G, ±5%, SMD 0603; Manufacturer: TDK; Manufacturer Part Number: CGA3E2C0G1H180JT0Y0N; Package Size: 0603; JLCPCB Basic Part: No; JLCPCB Part Number: C342890; Supplier 1: LCSC; Category: Capacitors - MLCC; Supplier Part Number 1: C342890; Tolerance: ±5%; Voltage Rating: 50V; Temperature Coefficient: C0G; RoHS: Yes; ComponentLink1Description: Datasheet; ComponentLink1URL: https://wmsc.lcsc.com/wmsc/upload/file/pdf/v2/lcsc/2304140030_TDK-CGA3E2C0G1H180JT0Y0N_C342890.pdf; ComponentLink2Description: JLCPCB Part URL; ComponentLink2URL: https://jlcpcb.com/partdetail/C342890; ComponentLink3Description: LCSC Part URL; ComponentLink3URL: https://lcsc.com/product-detail/Multilayer-Ceramic-Capacitors-MLCC---SMD-SMT_TDK-TDK-CGA3E2C0G1H180JT0Y0N_C342890.html
footprint CAP-0603 (0603 (1608M) Capacitor)
pins: 1, 2

## CGA3E2C0G1H220JT0Y0N
designator C?  Capacitance: 22pF  (hidden comment: *)
Capacitor, Ceramic (MLCC), 22pF, ±5%, 50V, C0G, ±5%, SMD 0603; Manufacturer: TDK; Manufacturer Part Number: CGA3E2C0G1H220JT0Y0N; Package Size: 0603; JLCPCB Basic Part: No; JLCPCB Part Number: C338053; Supplier 1: LCSC; Category: Capacitors - MLCC; Supplier Part Number 1: C338053; Tolerance: ±5%; Voltage Rating: 50V; Temperature Coefficient: C0G; RoHS: Yes; ComponentLink1Description: Datasheet; ComponentLink1URL: https://wmsc.lcsc.com/wmsc/upload/file/pdf/v2/lcsc/2304140030_TDK-CGA3E2C0G1H220JT0Y0N_C338053.pdf; ComponentLink2Description: JLCPCB Part URL; ComponentLink2URL: https://jlcpcb.com/partdetail/C338053; ComponentLink3Description: LCSC Part URL; ComponentLink3URL: https://lcsc.com/product-detail/Multilayer-Ceramic-Capacitors-MLCC---SMD-SMT_TDK-TDK-CGA3E2C0G1H220JT0Y0N_C338053.html
footprint CAP-0603 (0603 (1608M) Capacitor)
pins: 1, 2

## CGA3E2C0G1H221JT0Y0N
designator C?  Capacitance: 220pF  (hidden comment: *)
Capacitor, Ceramic (MLCC), 220pF, ±5%, 50V, C0G, ±5%, SMD 0603; Manufacturer: TDK; Manufacturer Part Number: CGA3E2C0G1H221JT0Y0N; Package Size: 0603; JLCPCB Basic Part: No; JLCPCB Part Number: C342909; Supplier 1: LCSC; Category: Capacitors - MLCC; Supplier Part Number 1: C342909; Tolerance: ±5%; Voltage Rating: 50V; Temperature Coefficient: C0G; RoHS: Yes; ComponentLink1Description: Datasheet; ComponentLink1URL: https://wmsc.lcsc.com/wmsc/upload/file/pdf/v2/lcsc/2304140030_TDK-CGA3E2C0G1H221JT0Y0N_C342909.pdf; ComponentLink2Description: JLCPCB Part URL; ComponentLink2URL: https://jlcpcb.com/partdetail/C342909; ComponentLink3Description: LCSC Part URL; ComponentLink3URL: https://lcsc.com/product-detail/Multilayer-Ceramic-Capacitors-MLCC---SMD-SMT_TDK-TDK-CGA3E2C0G1H221JT0Y0N_C342909.html
footprint CAP-0603 (0603 (1608M) Capacitor)
pins: 1, 2

## CGA3E2C0G1H222JT0Y0N
designator C?  Capacitance: 2.2nF  (hidden comment: *)
Capacitor, Ceramic (MLCC), 2.2nF, ±5%, 50V, C0G, ±5%, SMD 0603; Manufacturer: TDK; Manufacturer Part Number: CGA3E2C0G1H222JT0Y0N; Package Size: 0603; JLCPCB Basic Part: No; JLCPCB Part Number: C412299; Supplier 1: LCSC; Category: Capacitors - MLCC; Supplier Part Number 1: C412299; Tolerance: ±5%; Voltage Rating: 50V; Temperature Coefficient: C0G; RoHS: Yes; ComponentLink1Description: Datasheet; ComponentLink1URL: https://wmsc.lcsc.com/wmsc/upload/file/pdf/v2/lcsc/2304140030_TDK-CGA3E2C0G1H222JT0Y0N_C412299.pdf; ComponentLink2Description: JLCPCB Part URL; ComponentLink2URL: https://jlcpcb.com/partdetail/C412299; ComponentLink3Description: LCSC Part URL; ComponentLink3URL: https://lcsc.com/product-detail/Multilayer-Ceramic-Capacitors-MLCC---SMD-SMT_TDK-TDK-CGA3E2C0G1H222JT0Y0N_C412299.html
footprint CAP-0603 (0603 (1608M) Capacitor)
pins: 1, 2

## CGA3E2C0G1H270J080AA
designator C?  Capacitance: 27pF  (hidden comment: *)
Capacitor, Ceramic (MLCC), 27pF, ±5%, 50V, C0G, ±5%, SMD 0603; Manufacturer: TDK; Manufacturer Part Number: CGA3E2C0G1H270J080AA; Package Size: 0603; JLCPCB Basic Part: No; JLCPCB Part Number: C193086; Supplier 1: LCSC; Category: Capacitors - MLCC; Supplier Part Number 1: C193086; Tolerance: ±5%; Voltage Rating: 50V; Temperature Coefficient: C0G; RoHS: Yes; ComponentLink1Description: Datasheet; ComponentLink1URL: https://wmsc.lcsc.com/wmsc/upload/file/pdf/v2/lcsc/2304140030_TDK-CGA3E2C0G1H270J080AA_C193086.pdf; ComponentLink2Description: JLCPCB Part URL; ComponentLink2URL: https://jlcpcb.com/partdetail/C193086; ComponentLink3Description: LCSC Part URL; ComponentLink3URL: https://lcsc.com/product-detail/Multilayer-Ceramic-Capacitors-MLCC---SMD-SMT_TDK-TDK-CGA3E2C0G1H270J080AA_C193086.html
footprint CAP-0603 (0603 (1608M) Capacitor)
pins: 1, 2

## CGA3E2C0G1H270JT0Y0N
designator C?  Capacitance: 27pF  (hidden comment: *)
Capacitor, Ceramic (MLCC), 27pF, ±5%, 50V, C0G, ±5%, SMD 0603; Manufacturer: TDK; Manufacturer Part Number: CGA3E2C0G1H270JT0Y0N; Package Size: 0603; JLCPCB Basic Part: No; JLCPCB Part Number: C342893; Supplier 1: LCSC; Category: Capacitors - MLCC; Supplier Part Number 1: C342893; Tolerance: ±5%; Voltage Rating: 50V; Temperature Coefficient: C0G; RoHS: Yes; ComponentLink1Description: Datasheet; ComponentLink1URL: https://wmsc.lcsc.com/wmsc/upload/file/pdf/v2/lcsc/2304140030_TDK-CGA3E2C0G1H270JT0Y0N_C342893.pdf; ComponentLink2Description: JLCPCB Part URL; ComponentLink2URL: https://jlcpcb.com/partdetail/C342893; ComponentLink3Description: LCSC Part URL; ComponentLink3URL: https://lcsc.com/product-detail/Multilayer-Ceramic-Capacitors-MLCC---SMD-SMT_TDK-TDK-CGA3E2C0G1H270JT0Y0N_C342893.html
footprint CAP-0603 (0603 (1608M) Capacitor)
pins: 1, 2

## CGA3E2C0G1H271JT0Y0N
designator C?  Capacitance: 270pF  (hidden comment: *)
Capacitor, Ceramic (MLCC), 270pF, ±5%, 50V, C0G, ±5%, SMD 0603; Manufacturer: TDK; Manufacturer Part Number: CGA3E2C0G1H271JT0Y0N; Package Size: 0603; JLCPCB Basic Part: No; JLCPCB Part Number: C694496; Supplier 1: LCSC; Category: Capacitors - MLCC; Supplier Part Number 1: C694496; Tolerance: ±5%; Voltage Rating: 50V; Temperature Coefficient: C0G; RoHS: Yes; ComponentLink1Description: Datasheet; ComponentLink1URL: https://wmsc.lcsc.com/wmsc/upload/file/pdf/v2/lcsc/2304140030_TDK-CGA3E2C0G1H271JT0Y0N_C694496.pdf; ComponentLink2Description: JLCPCB Part URL; ComponentLink2URL: https://jlcpcb.com/partdetail/C694496; ComponentLink3Description: LCSC Part URL; ComponentLink3URL: https://lcsc.com/product-detail/Multilayer-Ceramic-Capacitors-MLCC---SMD-SMT_TDK-TDK-CGA3E2C0G1H271JT0Y0N_C694496.html
footprint CAP-0603 (0603 (1608M) Capacitor)
pins: 1, 2
